# Altium footprint library 5.12-直插元件.PcbLib: 165 footprints (part 11 of 11)
Each footprint in its own frame and in the unit in brackets; x right, y up, seen from the top. Pads: shape width x height; smd on the part's side, far side on the other; paste and mask are expansions set on the pad; w line width, h text height; cw(c..) or ccw(c..) is an arc to the next point about the centre after c.
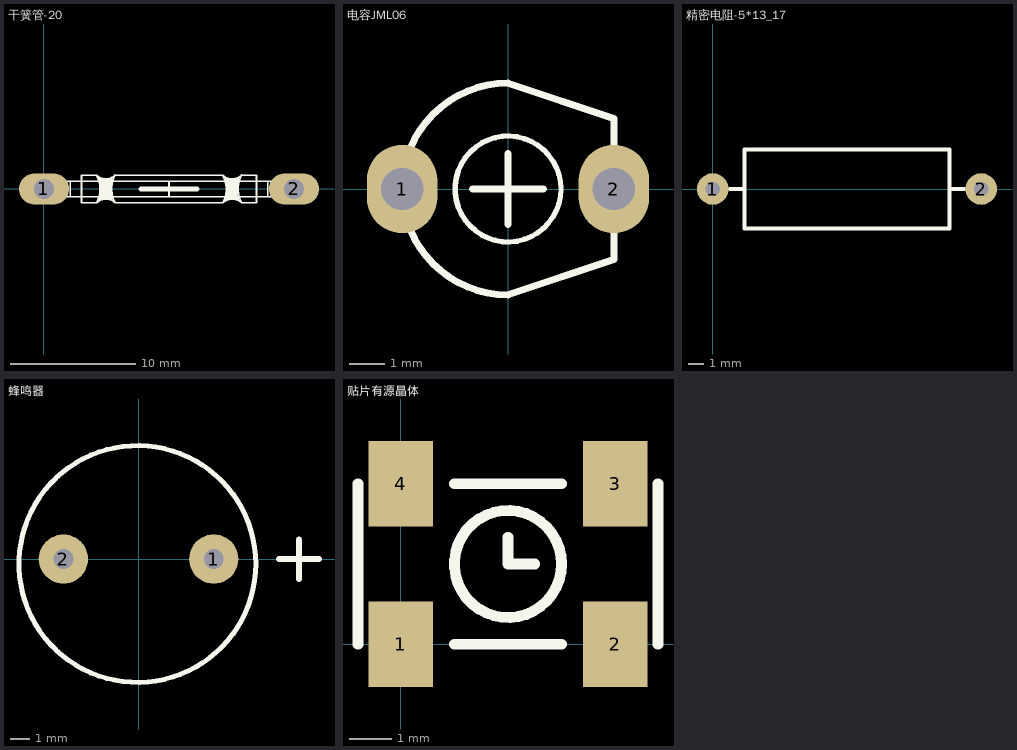
[diagram p10: the footprints below, top view; thin cyan lines are the x and y axes]

## 干簧管-20 [mm] "[ PCBѧϰȺ514746572 ]"
pads (2):
  oval 4x2.5 hole 1.6: 1(0,0) 2(20,0)
Top Overlay:
  lines w0.15: 1.8,-0.62 1.8,0.61 ; 2.1,-0.62 2.1,0.62 ; 2.99,0.62 4.4,0.62 ; 4.2,-1.1 3,-1.1 3,-0.62 ; 4.208,-1.102 cw(c4.96,-1.93) 5.71,-1.1 14.3,-1.1 ; 4.208,1.098 cw(c2.19,-0.01) 4.215,-1.105 ; 4.41,-0.62 3,-0.62 ; 5.49,-0.62 14.5,-0.62 ; 5.49,0.62 14.49,0.62 ; 5.685,1.105 ccw(c7.71,0.01) 5.692,-1.098 ; 5.702,1.102 cw(c4.95,1.93) 4.2,1.1 3,1.1 3,0.62 ; 5.707,1.098 14.298,1.098 ; 10,-0.62 10,0.62 ; 15.61,0.62 17,0.62 ; 15.62,-0.62 17.01,-0.62 ; 15.805,1.105 ccw(c17.83,0.01) 15.812,-1.098 ; 16.998,1.098 16.998,-1.102 15.808,-1.102 ccw(c15.058,-1.932) 14.305,-1.105 ccw(c12.28,-0.01) 14.298,1.098 ; 17,1.1 15.8,1.1 cw(c15.048,1.928) 14.298,1.098 ; 17.9,-0.62 17.9,0.61 ; 18.2,-0.62 18.2,0.61 ; 3,-0.62 3,0 3,0.62 ; 3,-0.62 1,-0.62 0.5,-0.62 0.5,0.62 1,0.62 3,0.62 ; 17,0.62 17,0 17,-0.62 19,-0.62 19.5,-0.62 19.5,0.62 19,0.62 17,0.62
  lines w0.254: 4.42,-0.74 5.44,-0.74 ; 4.42,0.74 5.43,0.74 ; 4.48,0.53 5.37,0.53 ; 4.49,-0.56 5.37,-0.56 ; 4.51,0.31 5.37,0.31 ; 4.52,-0.36 5.32,-0.36 ; 4.53,-0.15 5.28,-0.15 ; 4.54,0.09 5.3,0.09 ; 14.5,0.75 15.57,0.75 ; 14.52,-0.76 15.56,-0.76 ; 14.53,-0.72 15.46,-0.72 ; 14.57,0.52 15.49,0.52 ; 14.58,-0.55 15.43,-0.55 ; 14.62,-0.38 15.4,-0.38 ; 14.63,0.29 15.42,0.29 ; 14.64,-0.17 15.44,-0.17 ; 14.65,0.05 15.42,0.05
  lines w0.4: 7.75,0 12.25,0

## 电容JML06 [mm] "[ PCBѧϰȺ514746572 ]"
pads (2):
  oval 2x2.5 hole 1.2: 1(-3,0) 2(3,0)
Top Overlay:
  circle w0.15: c0,0 r1.5
  lines w0.2: -1,0 1,0 ; 0,-1 0,1 ; 0,-3 cw(c0,0) 0,3 3,2 3,-2 0,-3

## 精密电阻-5*13_17 [mm] "[ PCBѧϰȺ514746572 ]"
pads (2):
  round 2 hole 0.9: 1(0,0) 2(17,0)
Top Overlay:
  lines w0.254: 1.1,0 2,0 ; 15,0 15.9,0 ; 2,-2.5 15,-2.5 15,2.5 2,2.5 2,-2.5

## 蜂鸣器 [mm] "[ PCBѧϰȺ514746572 ]"
pads (2):
  round 2.5 hole 1: 1(3.81,0) 2(-3.81,0)
Top Overlay:
  circle w0.254: c-0.06,-0.25 r6
  lines w0.305: 7.112,0 9.144,0 ; 8.128,-1 8.128,1

## 贴片有源晶体 [mil] "[ PCBѧϰȺ514746572 ]"
pads (4):
  rect 60x80 smd: 1(0,0) 2(200,0) 3(200,150) 4(0,150)
Top Overlay:
  circle w10: c100,75 r50
  lines w10: -40,0 -40,150 ; 50,0 150,0 ; 50,150 150,150 ; 100,100 100,75 125,75 ; 240,0 240,150
3D body "User Library-VX3-Quartz-Oscillator.STEP": height 73.62, standoff 10.63, extent -37.5,-23.43 238.09,173.43